# Altium footprint library SG__PCB_HOLE_Connector.PcbLib: 154 footprints (part 7 of 10)
Each footprint in its own frame and in the unit in brackets; x right, y up, seen from the top. Pads: shape width x height; smd on the part's side, far side on the other; paste and mask are expansions set on the pad; w line width, h text height; cw(c..) or ccw(c..) is an arc to the next point about the centre after c.
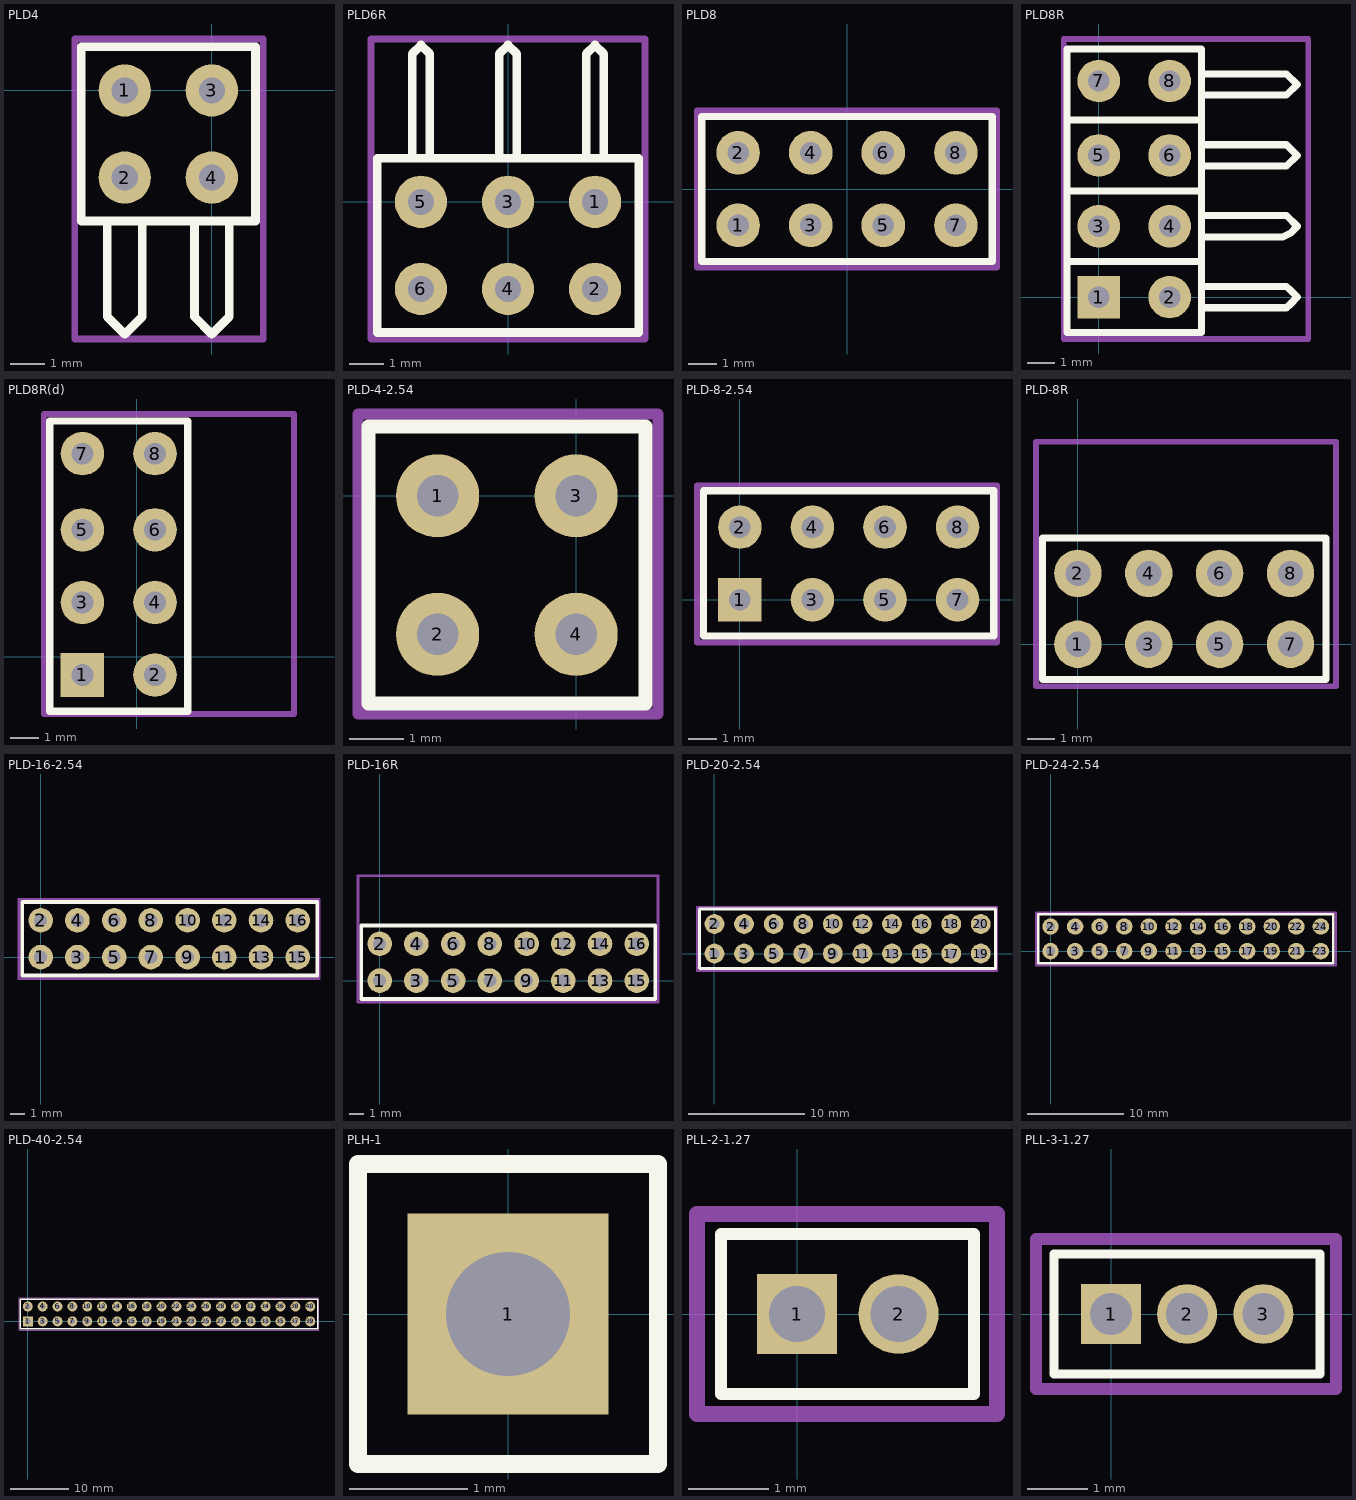
[diagram p6: the footprints below, top view; thin cyan lines are the x and y axes]

## PLD4 [mil]
pads (4):
  round 60 hole 30: 1(-100,0) 2(-100,-100) 3(0,0) 4(0,-100)
Top Overlay:
  lines w10: -120,-150 -120,-260 -100,-280 -80,-260 -80,-150 ; -20,-150 -20,-260 0,-280 20,-260 20,-150 ; -150,-150 50,-150 50,50 -150,50 -150,-150
Top Courtyard:
  lines w7.87: -157.48,-285.43 -157.48,59.06 59.06,59.06 59.06,-285.43 -157.48,-285.43
3D body "pld.stp": height 298.43, standoff 0, extent -50,-280 50,51.5
3D body "pld.stp": height 298.43, standoff 0, extent -150,-280 -50,51.5

## PLD6R [mil]
pads (6):
  round 60 hole 30: 1(100,0) 2(100,-100) 3(0,0) 4(0,-100) 5(-100,0) 6(-100,-100)
Top Overlay:
  lines w10: -110,50 -110,170 -100,180 -90,170 -90,50 ; -10,50 -10,170 0,180 10,170 10,50 ; 90,50 90,170 100,180 110,170 110,50 ; -150,-150 150,-150 150,50 -150,50 -150,-150
Top Courtyard:
  lines w7.87: -157.48,-157.48 -157.48,187.01 157.48,187.01 157.48,-157.48 -157.48,-157.48
3D body "pld.stp": height -39.37, standoff -337.8, extent -150,-150 -50,181.5
3D body "pld.stp": height -39.37, standoff -337.8, extent -50,-150 50,181.5
3D body "pld.stp": height -39.37, standoff -337.8, extent 50,-150 150,181.5

## PLD8 [mil]
pads (8):
  round 60 hole 30: 1(-150,-50) 2(-150,50) 3(-50,-50) 4(-50,50) 5(50,-50) 6(50,50) 7(150,-50) 8(150,50)
Top Overlay:
  lines w10: -200,-100 200,-100 200,100 -200,100 -200,-100
Top Courtyard:
  lines w7.87: -206.69,-108.27 -206.69,108.27 206.69,108.27 206.69,-108.27 -206.69,-108.27
3D body "header2.stp": height 332.68, standoff 0, extent 101.78,-96.45 198.23,96.46
3D body "header2.stp": height 332.68, standoff 0, extent 1.78,-96.45 98.23,96.46
3D body "header2.stp": height 332.68, standoff 0, extent -98.22,-96.45 -1.77,96.46
3D body "header2.stp": height 332.68, standoff 0, extent -198.23,-96.45 -101.78,96.46

## PLD8R [mil] "PLD8 3d up"
pads (8):
  rect 60x60 hole 30: 1(0,0)
  round 60 hole 30: 2(100,0) 3(0,100) 4(100,100) 5(0,200) 6(100,200) 7(0,305) 8(100,305)
Top Overlay:
  lines w10: -45,50 145,50 ; -45,150 145,150 ; -45,250 145,250 ; 145,-15 265,-15 270,-10 280,0 270,10 265,15 145,15 ; 145,85 260,85 270,90 280,100 265,115 260,115 145,115 ; 145,185 260,185 265,185 280,200 265,215 260,215 145,215 ; 145,285 260,285 265,285 280,300 265,315 260,315 145,315 ; -45,-50 -45,350 145,350 145,-50 -45,-50
Top Courtyard:
  lines w7.87: -49.21,-59.06 -49.21,364.17 295.28,364.17 295.28,-59.06 -49.21,-59.06
3D body "pld.stp": height 298.43, standoff 0, extent -46.5,250 285,350
3D body "pld.stp": height 298.43, standoff 0, extent -45.75,150 285.75,250
3D body "pld.stp": height 298.43, standoff 0, extent -45.75,50 285.75,150
3D body "pld.stp": height 298.43, standoff 0, extent -45.75,-50 285.75,50

## PLD8R(d) [mil] "PLD8 3d down"
pads (8):
  rect 60x60 hole 30: 1(-75,-25)
  round 60 hole 30: 2(25,-25) 3(-75,75) 4(25,75) 5(-75,175) 6(25,175) 7(-75,280) 8(25,280)
Top Overlay:
  lines w10: -120,-75 -120,325 70,325 70,-75 -120,-75
Bottom Overlay:
  lines w10: -120,25 70,25 ; -120,125 70,125 ; -120,225 70,225 ; 70,-40 190,-40 195,-35 205,-25 195,-15 190,-10 70,-10 ; 70,60 185,60 195,65 205,75 190,90 185,90 70,90 ; 70,160 185,160 190,160 205,175 190,190 185,190 70,190 ; 70,260 185,260 190,260 205,275 190,290 185,290 70,290 ; -120,-75 -120,325 70,325 70,-75 -120,-75
Top Courtyard:
  lines w7.87: -127.95,-78.74 -127.95,334.65 216.54,334.65 216.54,-78.74 -127.95,-78.74
3D body "pld.stp": height -2, standoff -300.43, extent -120.75,-75 210.75,25
3D body "pld.stp": height -2, standoff -300.43, extent -120.75,25 210.75,125
3D body "pld.stp": height -2, standoff -300.43, extent -120.75,125 210.75,225
3D body "pld.stp": height -2, standoff -300.43, extent -121.49,225 210,325

## PLD-4-2.54 [mil]
pads (4):
  round 60 hole 30: 1(-100,0) 2(-100,-100) 3(0,0) 4(0,-100)
Top Overlay:
  lines w10: -150,-150 50,-150 50,50 -150,50 -150,-150
Top Courtyard:
  lines w7.87: -157.48,-157.48 59.06,-157.48 59.06,59.06 -157.48,59.06 -157.48,-157.48
3D body "header2.stp": height 332.68, standoff 0, extent -146.46,-48.23 46.46,48.23
3D body "header2.stp": height 332.68, standoff 0, extent -146.45,-148.22 46.46,-51.77

## PLD-8-2.54 [mil]
pads (8):
  rect 60x60 hole 30: 1(0,0)
  round 60 hole 30: 2(0,100) 3(100,0) 4(100,100) 5(200,0) 6(200,100) 7(300,0) 8(300,100)
Top Overlay:
  lines w10: -50,-50 -50,150 350,150 350,-50 -50,-50
Top Courtyard:
  lines w7.87: -59.06,-59.06 -59.06,157.48 354.33,157.48 354.33,-59.06 -59.06,-59.06
3D body "header2.stp": height 332.68, standoff 0, extent -48.23,-46.45 48.22,146.46
3D body "header2.stp": height 332.68, standoff 0, extent 51.78,-46.45 148.23,146.46
3D body "header2.stp": height 332.68, standoff 0, extent 151.78,-46.45 248.23,146.46
3D body "header2.stp": height 332.68, standoff 0, extent 251.78,-46.45 348.23,146.46

## PLD-8R [mm]
pads (8):
  round 1.7 hole 0.9: 1(0,0) 2(0,2.54) 3(2.54,0) 4(2.54,2.54) 5(5.08,0) 6(5.08,2.54) 7(7.62,0) 8(7.62,2.54)
Top Overlay:
  lines w0.254: -1.27,-1.27 -1.27,3.81 8.89,3.81 8.89,-1.27 -1.27,-1.27
Top Courtyard:
  lines w0.2: -1.5,-1.5 -1.5,7.25 9.25,7.25 9.25,-1.5 -1.5,-1.5
3D body "pld.stp": height 7.58, standoff 0, extent -1.27,-1.308 1.27,7.112
3D body "pld.stp": height 7.58, standoff 0, extent 1.27,-1.308 3.81,7.112
3D body "pld.stp": height 7.58, standoff 0, extent 3.81,-1.308 6.35,7.112
3D body "pld.stp": height 7.58, standoff 0, extent 6.35,-1.308 8.89,7.112

## PLD-16-2.54 [mm]
pads (16):
  round 1.7 hole 0.9: 1(0,0) 2(0,2.54) 3(2.54,0) 4(2.54,2.54) 5(5.08,0) 6(5.08,2.54) 7(7.62,0) 8(7.62,2.54) 9(10.16,0) 10(10.16,2.54) 11(12.7,0) 12(12.7,2.54) 13(15.24,0) 14(15.24,2.54) 15(17.78,0) 16(17.78,2.54)
Top Overlay:
  lines w0.254: -1.27,-1.27 19.126,-1.27 19.126,3.81 -1.27,3.81 -1.27,-1.27
Top Courtyard:
  lines w0.2: -1.5,-1.5 -1.5,4 19.25,4 19.25,-1.5 -1.5,-1.5
3D body "header2.stp": height 8.45, standoff 0, extent 6.395,-1.18 8.845,3.72
3D body "header2.stp": height 8.45, standoff 0, extent 3.855,-1.18 6.305,3.72
3D body "header2.stp": height 8.45, standoff 0, extent 1.315,-1.18 3.765,3.72
3D body "header2.stp": height 8.45, standoff 0, extent -1.225,-1.18 1.225,3.72
3D body "header2.stp": height 8.45, standoff 0, extent 8.935,-1.18 11.385,3.72
3D body "header2.stp": height 8.45, standoff 0, extent 11.475,-1.18 13.925,3.72
3D body "header2.stp": height 8.45, standoff 0, extent 14.015,-1.18 16.465,3.72
3D body "header2.stp": height 8.45, standoff 0, extent 16.555,-1.18 19.005,3.72

## PLD-16R [mm]
pads (16):
  round 1.7 hole 0.9: 1(0,0) 2(0,2.54) 3(2.54,0) 4(2.54,2.54) 5(5.08,0) 6(5.08,2.54) 7(7.62,0) 8(7.62,2.54) 9(10.16,0) 10(10.16,2.54) 11(12.7,0) 12(12.7,2.54) 13(15.24,0) 14(15.24,2.54) 15(17.78,0) 16(17.78,2.54)
Top Overlay:
  lines w0.254: -1.27,-1.27 19.05,-1.27 19.05,3.81 -1.27,3.81 -1.27,-1.27
Top Courtyard:
  lines w0.2: -1.5,-1.5 -1.5,7.25 19.25,7.25 19.25,-1.5 -1.5,-1.5
3D body "pld.stp": height 7.58, standoff 0, extent 16.51,-1.308 19.05,7.112
3D body "pld.stp": height 7.58, standoff 0, extent 13.97,-1.308 16.51,7.112
3D body "pld.stp": height 7.58, standoff 0, extent 11.43,-1.308 13.97,7.112
3D body "pld.stp": height 7.58, standoff 0, extent 8.89,-1.308 11.43,7.112
3D body "pld.stp": height 7.58, standoff 0, extent 6.35,-1.308 8.89,7.112
3D body "pld.stp": height 7.58, standoff 0, extent 3.81,-1.308 6.35,7.112
3D body "pld.stp": height 7.58, standoff 0, extent 1.27,-1.308 3.81,7.112
3D body "pld.stp": height 7.58, standoff 0, extent -1.27,-1.308 1.27,7.112

## PLD-20-2.54 [mm]
pads (20):
  round 1.7 hole 0.9: 1(0,0) 2(0,2.54) 3(2.54,0) 4(2.54,2.54) 5(5.08,0) 6(5.08,2.54) 7(7.62,0) 8(7.62,2.54) 9(10.16,0) 10(10.16,2.54) 11(12.7,0) 12(12.7,2.54) 13(15.24,0) 14(15.24,2.54) 15(17.78,0) 16(17.78,2.54) 17(20.32,0) 18(20.32,2.54) 19(22.86,0) 20(22.86,2.54)
Top Overlay:
  lines w0.254: -1.27,-1.27 -1.27,3.81 24.13,3.81 24.13,-1.27 -1.27,-1.27
Top Courtyard:
  lines w0.2: -1.5,-1.5 -1.5,4 24.25,4 24.25,-1.5 -1.5,-1.5
3D body "header2.stp": height 8.45, standoff 0, extent 6.395,-1.18 8.845,3.72
3D body "header2.stp": height 8.45, standoff 0, extent 3.855,-1.18 6.305,3.72
3D body "header2.stp": height 8.45, standoff 0, extent 1.315,-1.18 3.765,3.72
3D body "header2.stp": height 8.45, standoff 0, extent -1.225,-1.18 1.225,3.72
3D body "header2.stp": height 8.45, standoff 0, extent 8.935,-1.18 11.385,3.72
3D body "header2.stp": height 8.45, standoff 0, extent 11.475,-1.18 13.925,3.72
3D body "header2.stp": height 8.45, standoff 0, extent 14.015,-1.18 16.465,3.72
3D body "header2.stp": height 8.45, standoff 0, extent 16.555,-1.18 19.005,3.72
3D body "header2.stp": height 8.45, standoff 0, extent 19.095,-1.18 21.545,3.72
3D body "header2.stp": height 8.45, standoff 0, extent 21.635,-1.18 24.085,3.72

## PLD-24-2.54 [mm]
pads (24):
  round 1.7 hole 0.9: 1(0,0) 2(0,2.54) 3(2.54,0) 4(2.54,2.54) 5(5.08,0) 6(5.08,2.54) 7(7.62,0) 8(7.62,2.54) 9(10.16,0) 10(10.16,2.54) 11(12.7,0) 12(12.7,2.54) 13(15.24,0) 14(15.24,2.54) 15(17.78,0) 16(17.78,2.54) 17(20.32,0) 18(20.32,2.54) 19(22.86,0) 20(22.86,2.54) 21(25.4,0) 22(25.4,2.54) 23(27.94,0) 24(27.94,2.54)
Top Overlay:
  lines w0.254: -1.27,-1.27 -1.27,3.81 29.21,3.81 29.21,-1.27 -1.27,-1.27
Top Courtyard:
  lines w0.2: -1.5,-1.5 -1.5,4 29.5,4 29.5,-1.5 -1.5,-1.5
3D body "header2.stp": height 8.45, standoff 0, extent 16.555,-1.18 19.005,3.72
3D body "header2.stp": height 8.45, standoff 0, extent 14.015,-1.18 16.465,3.72
3D body "header2.stp": height 8.45, standoff 0, extent 11.475,-1.18 13.925,3.72
3D body "header2.stp": height 8.45, standoff 0, extent 8.935,-1.18 11.385,3.72
3D body "header2.stp": height 8.45, standoff 0, extent -1.225,-1.18 1.225,3.72
3D body "header2.stp": height 8.45, standoff 0, extent 1.315,-1.18 3.765,3.72
3D body "header2.stp": height 8.45, standoff 0, extent 3.855,-1.18 6.305,3.72
3D body "header2.stp": height 8.45, standoff 0, extent 6.395,-1.18 8.845,3.72
3D body "header2.stp": height 8.45, standoff 0, extent 19.095,-1.18 21.545,3.72
3D body "header2.stp": height 8.45, standoff 0, extent 21.635,-1.18 24.085,3.72
3D body "header2.stp": height 8.45, standoff 0, extent 24.175,-1.18 26.625,3.72
3D body "header2.stp": height 8.45, standoff 0, extent 26.715,-1.18 29.165,3.72

## PLD-40-2.54 [mm]
pads (40):
  rect 1.7x1.7 hole 0.9: 1(0,0)
  round 1.7 hole 0.9: 2(0,2.54) 3(2.54,0) 4(2.54,2.54) 5(5.08,0) 6(5.08,2.54) 7(7.62,0) 8(7.62,2.54) 9(10.16,0) 10(10.16,2.54) 11(12.7,0) 12(12.7,2.54) 13(15.24,0) 14(15.24,2.54) 15(17.78,0) 16(17.78,2.54) 17(20.32,0) 18(20.32,2.54) 19(22.86,0) 20(22.86,2.54) 21(25.4,0) 22(25.4,2.54) 23(27.94,0) 24(27.94,2.54) 25(30.48,0) 26(30.48,2.54) 27(33.02,0) 28(33.02,2.54) 29(35.56,0) 30(35.56,2.54) 31(38.1,0) 32(38.1,2.54) 33(40.64,0) 34(40.64,2.54) 35(43.18,0) 36(43.18,2.54) 37(45.72,0) 38(45.72,2.54) 39(48.26,0) 40(48.26,2.54)
Top Overlay:
  lines w0.254: -1.27,-1.27 24.13,-1.27 49.53,-1.27 49.53,3.81 24.13,3.81 -1.27,3.81 -1.27,-1.27
Top Courtyard:
  lines w0.2: -1.5,-1.5 -1.5,4 49.75,4 49.75,-1.5 -1.5,-1.5
3D body "PLS1.stp": height 8.54, standoff -3, extent 46.99,-1.27 49.53,1.27
3D body "PLS1.stp": height 8.54, standoff -3, extent 46.99,1.27 49.53,3.81
3D body "PLS1.stp": height 8.54, standoff -3, extent 44.45,-1.27 46.99,1.27
3D body "PLS1.stp": height 8.54, standoff -3, extent 44.45,1.27 46.99,3.81
3D body "PLS1.stp": height 8.54, standoff -3, extent 41.91,-1.27 44.45,1.27
3D body "PLS1.stp": height 8.54, standoff -3, extent 41.91,1.27 44.45,3.81
3D body "PLS1.stp": height 8.54, standoff -3, extent 39.37,-1.27 41.91,1.27
3D body "PLS1.stp": height 8.54, standoff -3, extent 39.37,1.27 41.91,3.81
3D body "PLS1.stp": height 8.54, standoff -3, extent 36.83,-1.27 39.37,1.27
3D body "PLS1.stp": height 8.54, standoff -3, extent 36.83,1.27 39.37,3.81
3D body "PLS1.stp": height 8.54, standoff -3, extent 34.29,-1.27 36.83,1.27
3D body "PLS1.stp": height 8.54, standoff -3, extent 34.29,1.27 36.83,3.81
3D body "PLS1.stp": height 8.54, standoff -3, extent 31.75,-1.27 34.29,1.27
3D body "PLS1.stp": height 8.54, standoff -3, extent 31.75,1.27 34.29,3.81
3D body "PLS1.stp": height 8.54, standoff -3, extent 29.21,-1.27 31.75,1.27
3D body "PLS1.stp": height 8.54, standoff -3, extent 29.21,1.27 31.75,3.81
3D body "PLS1.stp": height 8.54, standoff -3, extent 26.67,-1.27 29.21,1.27
3D body "PLS1.stp": height 8.54, standoff -3, extent 26.67,1.27 29.21,3.81
3D body "PLS1.stp": height 8.54, standoff -3, extent 24.13,-1.27 26.67,1.27
3D body "PLS1.stp": height 8.54, standoff -3, extent 24.13,1.27 26.67,3.81
3D body "PLS1.stp": height 8.54, standoff -3, extent 21.59,-1.27 24.13,1.27
3D body "PLS1.stp": height 8.54, standoff -3, extent 21.59,1.27 24.13,3.81
3D body "PLS1.stp": height 8.54, standoff -3, extent 19.05,-1.27 21.59,1.27
3D body "PLS1.stp": height 8.54, standoff -3, extent 19.05,1.27 21.59,3.81
3D body "PLS1.stp": height 8.54, standoff -3, extent 16.51,-1.27 19.05,1.27
3D body "PLS1.stp": height 8.54, standoff -3, extent 16.51,1.27 19.05,3.81
3D body "PLS1.stp": height 8.54, standoff -3, extent 13.97,-1.27 16.51,1.27
3D body "PLS1.stp": height 8.54, standoff -3, extent 13.97,1.27 16.51,3.81
3D body "PLS1.stp": height 8.54, standoff -3, extent 11.43,-1.27 13.97,1.27
3D body "PLS1.stp": height 8.54, standoff -3, extent 11.43,1.27 13.97,3.81
3D body "PLS1.stp": height 8.54, standoff -3, extent 8.89,-1.27 11.43,1.27
3D body "PLS1.stp": height 8.54, standoff -3, extent 8.89,1.27 11.43,3.81
3D body "PLS1.stp": height 8.54, standoff -3, extent 6.35,-1.27 8.89,1.27
3D body "PLS1.stp": height 8.54, standoff -3, extent 6.35,1.27 8.89,3.81
3D body "PLS1.stp": height 8.54, standoff -3, extent 3.81,-1.27 6.35,1.27
3D body "PLS1.stp": height 8.54, standoff -3, extent 3.81,1.27 6.35,3.81
3D body "PLS1.stp": height 8.54, standoff -3, extent 1.27,-1.27 3.81,1.27
3D body "PLS1.stp": height 8.54, standoff -3, extent 1.27,1.27 3.81,3.81
3D body "PLS1.stp": height 8.54, standoff -3, extent -1.27,-1.27 1.27,1.27
3D body "PLS1.stp": height 8.54, standoff -3, extent -1.27,1.27 1.27,3.81

## PLH-1 [mm]
pads (1):
  rect 1.7x1.7 hole 1.05 mask+0.05: 1(0,0)
Top Overlay:
  lines w0.15: -1.27,-1.27 1.27,-1.27 1.27,1.27 -1.27,1.27 -1.27,-1.27

## PLL-2-1.27 [mm]
pads (2):
  rect 1x1 hole 0.7 mask+0.05: 1(0,0)
  round 1 hole 0.7 mask+0.05: 2(1.27,0)
Top Overlay:
  lines w0.15: -0.95,-1 -0.95,1 2.21,1 2.21,-1 -0.95,-1
Top Courtyard:
  lines w0.2: -1.25,-1.25 -1.25,1.25 2.5,1.25 2.5,-1.25 -1.25,-1.25

## PLL-3-1.27 [mm]
pads (3):
  rect 1x1 hole 0.7 mask+0.05: 1(0,0)
  round 1 hole 0.7 mask+0.05: 2(1.27,0) 3(2.54,0)
Top Overlay:
  lines w0.15: -0.95,-1 3.48,-1 3.48,1 -0.95,1 -0.95,-1
Top Courtyard:
  lines w0.2: -1.25,-1.25 -1.25,1.25 3.75,1.25 3.75,-1.25 -1.25,-1.25